# Altium footprint library tsl_Pcblib.PcbLib: 219 footprints (part 1 of 14)
Each footprint in its own frame and in the unit in brackets; x right, y up, seen from the top. Pads: shape width x height; smd on the part's side, far side on the other; paste and mask are expansions set on the pad; w line width, h text height; cw(c..) or ccw(c..) is an arc to the next point about the centre after c.
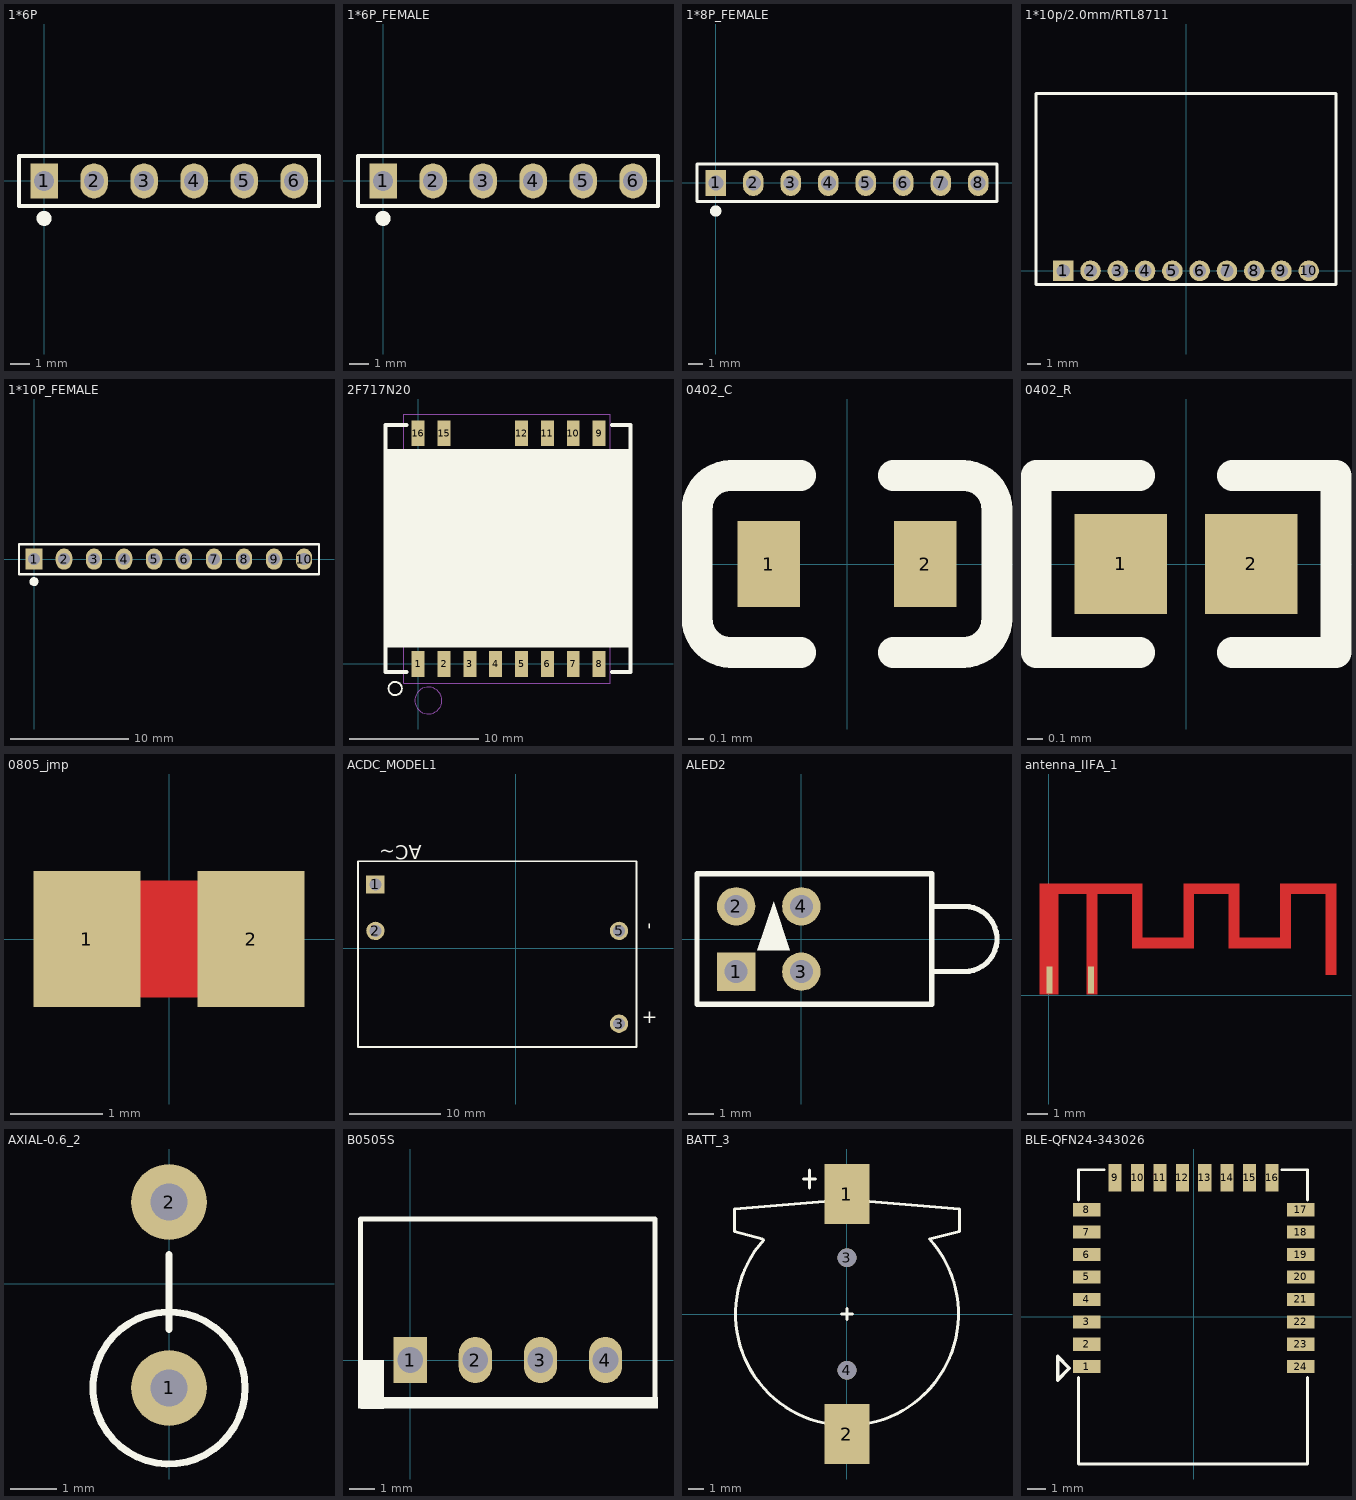
[diagram p0: the footprints below, top view; thin cyan lines are the x and y axes]

## 1*6P [mil]
height 236.22
pads (6):
  rect 55x70 hole 40: 1(0,0)
  oval 55x70 hole 40: 2(100,0) 3(200,0) 4(300,0) 5(400,0) 6(500,0)
Top Overlay:
  circle w15: c0.08,-75 r7.5
  lines w7.87: -50,-50 -50,50 550,50 550,-50 -50,-50

## 1*6P_FEMALE [mil]
height 236.22
pads (6):
  rect 55x70 hole 40: 1(0,0)
  oval 55x70 hole 40: 2(100,0) 3(200,0) 4(300,0) 5(400,0) 6(500,0)
Top Overlay:
  circle w15: c0.08,-75 r7.5
  lines w7.87: -50,-50 550,-50 550,50 -50,50 -50,-50
3D body "User Library-ZL262-3SG.step": height 340.71, standoff -114.02, extent -50,-49.22 250,49.21
3D body "User Library-ZL262-3SG.step": height 340.71, standoff -114.02, extent 250,-49.22 550,49.21

## 1*8P_FEMALE [mil]
height 236.22
pads (8):
  rect 55x70 hole 40: 1(0,0)
  oval 55x70 hole 40: 2(100,0) 3(200,0) 4(300,0) 5(400,0) 6(500,0) 7(600,0) 8(700,0)
Top Overlay:
  circle w15: c0.08,-75 r7.5
  lines w7.87: -50,-50 750,-50 750,50 -50,50 -50,-50
3D body "User Library-ZL262-4SG.step": height 340.71, standoff -114.02, extent 351,-50.21 751,48.21
3D body "User Library-ZL262-4SG.step": height 340.71, standoff -114.02, extent -49,-50.21 351,48.21

## 1*10p/2.0mm/RTL8711 [mm]
pads (10):
  rect 1.5x1.52 hole 0.96: 1(-9,0)
  oval 1.5x1.52 hole 0.96: 2(-7,0) 3(-5,0) 4(-3,0) 5(-1,0) 6(1,0) 7(3,0) 8(5,0) 9(7,0) 10(9,0)
Top Overlay:
  lines w0.2: -11,-1 11,-1 11,13 -11,13 -11,-1

## 1*10P_FEMALE [mil]
height 236.22
pads (10):
  rect 55x70 hole 40: 1(0,0)
  oval 55x70 hole 40: 2(100,0) 3(200,0) 4(300,0) 5(400,0) 6(500,0) 7(600,0) 8(700,0) 9(800,0) 10(900,0)
Top Overlay:
  circle w15: c0.08,-75 r7.5
  lines w7.87: -50,-50 -50,50 950,50 950,-50 -50,-50
3D body "User Library-ZL262-10SG.step": height 340.71, standoff -114.02, extent -50,-49.21 950,49.22

## 2F717N20 [mm]
pads (14):
  rect 1x2 smd paste-0.05 mask+0.05: 1(0,0) 2(2,0) 3(4,0) 4(6,0) 5(8,0) 6(10,0) 7(12,0) 8(14,0) 9(14,17.85) 10(12,17.85) 11(10,17.85) 12(8,17.85) 15(2,17.85) 16(0,17.85)
Top Overlay:
  circle w0.15: c-1.778,-1.905 r0.515
  rectangle: -2.54,1.27 16.445,16.637
  lines w0.305: -0.889,-0.635 -2.54,-0.635 -2.54,18.477 -0.889,18.477 ; 14.986,-0.635 16.445,-0.635 16.445,18.477 14.986,18.477
Mechanical 19:
  circle w0.025: c0.79,-2.836 r1.044
  lines w0.025: -1.128,-1.489 14.874,-1.489 14.874,19.339 -1.128,19.339 -1.128,-1.489
3D body: height 3, standoff 0.01, extent -2.54,0.127 16.383,17.907

## 0402_C [mil]
pads (2):
  rect 16x22 smd mask+2: 1(-20,0) 2(20,0)
Top Overlay:
  lines w7.87: -29.72,-22.64 cw(c-29.72,-13.98) -38.39,-13.98 -38.39,13.98 cw(c-29.72,13.98) -29.72,22.64 ; -29.53,-22.64 -11.81,-22.64 ; -29.53,22.64 -11.81,22.64 ; 11.81,-22.64 29.53,-22.64 ; 11.81,22.64 29.53,22.64 ; 29.72,-22.64 ccw(c29.72,-13.98) 38.39,-13.98 38.39,13.98 ccw(c29.72,13.98) 29.72,22.64
3D body "0402 SMD Capacitor.step": height 7.95, standoff 0, extent -19,-11.81 20.37,11.81

## 0402_R [mm]
pads (2):
  rect 0.6x0.65 smd mask+0.051: 1(-0.425,0) 2(0.425,0)
Top Overlay:
  lines w0.2: -0.3,-0.575 -0.975,-0.575 -0.975,0.575 -0.3,0.575 ; 0.3,-0.575 0.975,-0.575 0.975,0.575 0.3,0.575
3D body "User Library-RES_1005-0402.STEP": height 0.41, standoff 0, extent -0.575,-0.275 0.575,0.275

## 0805_jmp [mm]
pads (2):
  rect 1.16x1.47 smd paste-5 mask-5: 1(-0.89,0) 2(0.89,0)
Top Layer:
  rectangle: -1.397,-0.635 1.397,0.635

## ACDC_MODEL1 [mil] "ACDC_MODEL1"
pads (4):
  rect 79x79 hole 51: 1(-605,275)
  round 79 hole 51: 2(-605,75) 3(445,-325) 5(445,75)
Top Overlay:
  lines w8: -680,-425 -680,375 520,375 520,-425 -680,-425
  text "+" at 542.04,-323.22 h60
  text "-" at 552.82,110.96 h60
  text "AC~" at -405,445 h60

## ALED2 [mm]
height 10
pads (4):
  rect 1.5x1.5 hole 0.9: 1(-2.54,-1.27)
  round 1.5 hole 0.9: 2(-2.54,1.27) 3(0,-1.27) 4(0,1.27)
Top Overlay:
  region: -1.079,1.46 -0.445,-0.445 -1.714,-0.445
  lines w0.203: 5.08,-1.27 6.35,-1.27 ccw(c6.35,0) 6.35,1.27 5.08,1.27 ; -4.064,-2.54 -4.064,2.54 5.08,2.54 5.08,-2.54 -4.064,-2.54
3D body "LED Bi-Level 2xRED 3mm.step": height 9.65, standoff -3.68, extent -3.728,-2.161 10.332,2.159

## antenna_IIFA_1 [mm]
pads (2):
  rect 0.3x1.3 smd paste+0 mask-0.3: 1(2.06,0.74) 2(0.04,0.74)
Top Layer:
  region: 9.26,5.43 9.26,2.29 8.76,2.29 8.76,5.43
  region: 6.56,5.43 6.56,4.93 9.26,4.93 9.26,5.43
  region: 4.06,2.79 4.06,2.29 7.06,2.29 7.06,2.79
  region: 4.06,2.29 4.06,5.43 4.56,5.43 4.56,2.29
  region: 8.76,2.79 8.76,2.29 11.76,2.29 11.76,2.79
  region: 11.76,2.29 11.76,5.43 11.26,5.43 11.26,2.29
  region: 11.26,5.43 11.26,4.93 13.96,4.93 13.96,5.43
  region: 7.06,2.29 7.06,5.43 6.56,5.43 6.56,2.29
  region: -0.44,5.43 -0.44,0.04 0.46,0.04 0.46,5.43
  region: 13.96,5.43 13.96,0.99 13.46,0.99 13.46,5.43
  region: 1.86,5.43 1.86,0.04 2.36,0.04 2.36,5.43
  region: -0.44,5.43 -0.44,4.93 4.56,4.93 4.56,5.43

## AXIAL-0.6_2 [mil] "RES200"
pads (2):
  round 65 / inner round 55 / far side round 65 hole 31.5: 1(0,-89) 2(0,70)
Top Overlay:
  circle w6: c0,-89 r65
  lines w6: 0,-39 0,25

## B0505S [mm]
height 10.6
pads (4):
  rect 1.3x1.8 hole 1: 1(0,0)
  oval 1.3x1.8 hole 1: 2(2.54,0) 3(5.08,0) 4(7.62,0)
Top Overlay:
  rectangle: -1.94,-1.905 -1.016,0
  rectangle: -2.04,-1.9 9.67,-1.448
  lines w0.2: -1.94,-1.651 -1.94,5.5 9.56,5.5 9.56,-1.651
3D body: height 10, standoff 0.2, extent -1.905,-1.651 9.525,5.462

## BATT_3 [mm]
pads (4):
  rect 3x4 smd: 1(0,8) 2(0,-8)
  round 1.25 hole 1.25 unplated: 3(0,3.75) 4(0,-3.75)
Top Overlay:
  lines w0.2: -5.558,4.935 ccw(c0,0) -1.507,-7.279 ; -5.555,4.938 -5.625,5 -7.5,5.5 -7.5,7 -1.5,7.5 ; -2.9,9 -2.1,9 ; -2.5,8.4 -2.5,9.6 ; -0.375,0 0.375,0 ; 0,-0.375 0,0.375 ; 1.5,7.5 7.5,7 7.5,5.5 5.5,5 ; 1.507,-7.279 ccw(c0,0) 5.498,5.003
3D body "User Library-cr1220.STEP": height 0.8, standoff -4.14, extent -7.504,-9.285 7.493,9.215

## BLE-QFN24-343026 [mil] "BLE-QFN24-343026"
pads (24):
  rect 59.06x28 smd: 1(-229.09,-106.61) 2(-229.09,-58.61) 3(-229.09,-10.61) 4(-229.09,37.39) 5(-229.09,85.39) 6(-229.09,133.39) 7(-229.09,181.39) 8(-229.09,229.39) 17(229.09,229.39) 18(229.09,181.39) 19(229.09,133.39) 20(229.09,85.39) 21(229.09,37.39) 22(229.09,-10.61) 23(229.09,-58.61) 24(229.09,-106.61)
  rect 28x59.06 smd: 9(-168,297.8) 10(-120,297.8) 11(-72,297.8) 12(-24,297.8) 13(24,297.8) 14(72,297.8) 15(120,297.8) 16(168,297.8)
Top Overlay:
  lines w6: -246.22,-130 -246.22,-315 243.78,-315 243.78,-130 ; -246.22,250 -246.22,315 -191.22,315 ; 188.78,315 243.78,315 243.78,250
  lines w8: -291,-135 -266,-110 -291,-85 -291,-135
3D body "CYBLE-343026-01(3).stp": height 77.17, standoff -0.3, extent -236.22,-306.24 236.22,304